# Altium footprint library smd-ipc.PCBLIB: 363 footprints (part 24 of 27)
Each footprint in its own frame and in the unit in brackets; x right, y up, seen from the top. Pads: shape width x height; smd on the part's side, far side on the other; paste and mask are expansions set on the pad; w line width, h text height; cw(c..) or ccw(c..) is an arc to the next point about the centre after c.
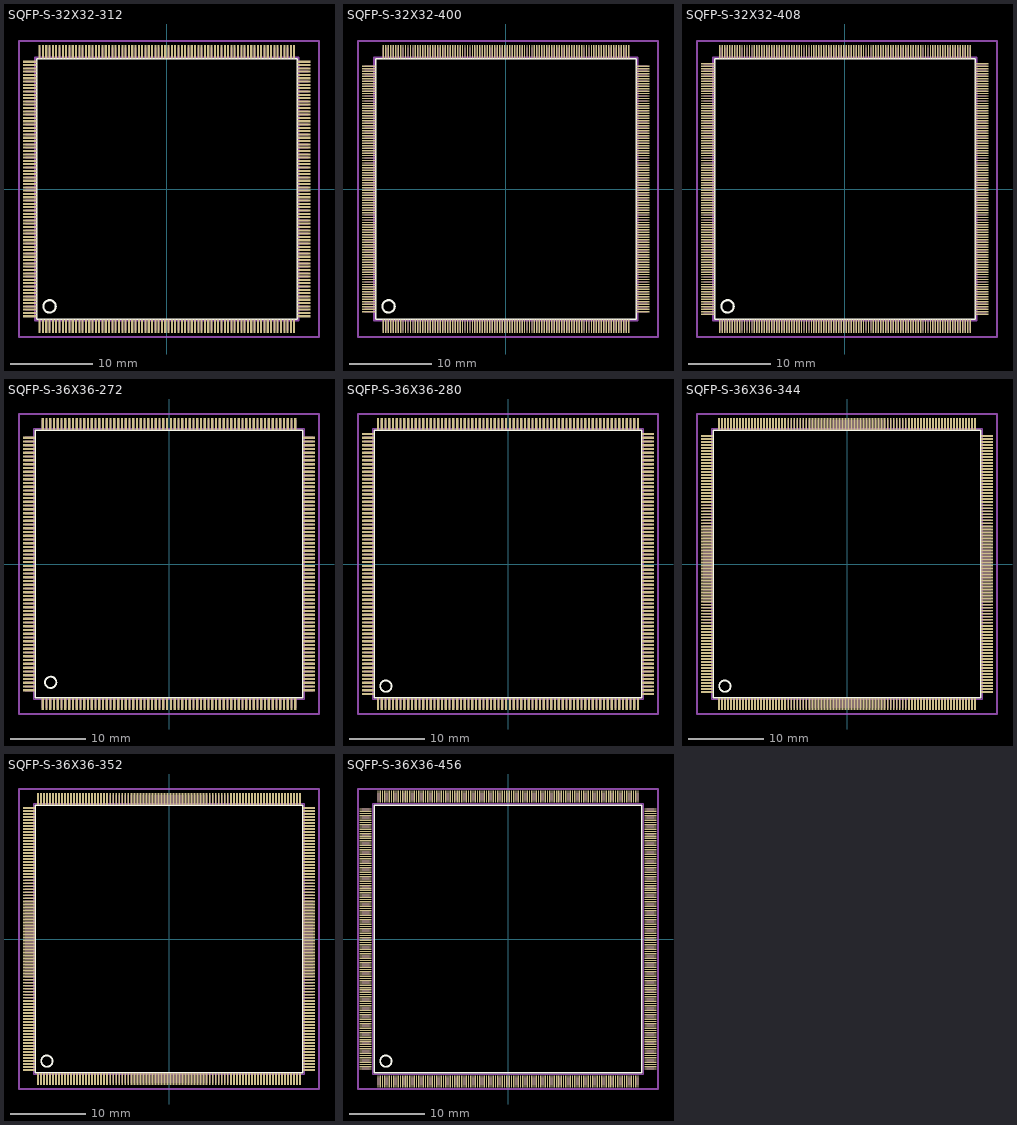
[diagram p23: the footprints below, top view; thin cyan lines are the x and y axes]

## SQFP-S-32X32-312 [mm]
pads (312):
  rect 0.25x1.6 smd: 1(-15.4,-16.6) 2(-15,-16.6) 3(-14.6,-16.6) 4(-14.2,-16.6) 5(-13.8,-16.6) 6(-13.4,-16.6) 7(-13,-16.6) 8(-12.6,-16.6) 9(-12.2,-16.6) 10(-11.8,-16.6) 11(-11.4,-16.6) 12(-11,-16.6) 13(-10.6,-16.6) 14(-10.2,-16.6) 15(-9.8,-16.6) 16(-9.4,-16.6) 17(-9,-16.6) 18(-8.6,-16.6) 19(-8.2,-16.6) 20(-7.8,-16.6) 21(-7.4,-16.6) 22(-7,-16.6) 23(-6.6,-16.6) 24(-6.2,-16.6) 25(-5.8,-16.6) 26(-5.4,-16.6) 27(-5,-16.6) 28(-4.6,-16.6) 29(-4.2,-16.6) 30(-3.8,-16.6) 31(-3.4,-16.6) 32(-3,-16.6) 33(-2.6,-16.6) 34(-2.2,-16.6) 35(-1.8,-16.6) 36(-1.4,-16.6) 37(-1,-16.6) 38(-0.6,-16.6) 39(-0.2,-16.6) 40(0.2,-16.6) 41(0.6,-16.6) 42(1,-16.6) 43(1.4,-16.6) 44(1.8,-16.6) 45(2.2,-16.6) 46(2.6,-16.6) 47(3,-16.6) 48(3.4,-16.6) 49(3.8,-16.6) 50(4.2,-16.6) 51(4.6,-16.6) 52(5,-16.6) 53(5.4,-16.6) 54(5.8,-16.6) 55(6.2,-16.6) 56(6.6,-16.6) 57(7,-16.6) 58(7.4,-16.6) 59(7.8,-16.6) 60(8.2,-16.6) 61(8.6,-16.6) 62(9,-16.6) 63(9.4,-16.6) 64(9.8,-16.6) 65(10.2,-16.6) 66(10.6,-16.6) 67(11,-16.6) 68(11.4,-16.6) 69(11.8,-16.6) 70(12.2,-16.6) 71(12.6,-16.6) 72(13,-16.6) 73(13.4,-16.6) 74(13.8,-16.6) 75(14.2,-16.6) 76(14.6,-16.6) 77(15,-16.6) 78(15.4,-16.6) 157(15.4,16.6) 158(15,16.6) 159(14.6,16.6) 160(14.2,16.6) 161(13.8,16.6) 162(13.4,16.6) 163(13,16.6) 164(12.6,16.6) 165(12.2,16.6) 166(11.8,16.6) 167(11.4,16.6) 168(11,16.6) 169(10.6,16.6) 170(10.2,16.6) 171(9.8,16.6) 172(9.4,16.6) 173(9,16.6) 174(8.6,16.6) 175(8.2,16.6) 176(7.8,16.6) 177(7.4,16.6) 178(7,16.6) 179(6.6,16.6) 180(6.2,16.6) 181(5.8,16.6) 182(5.4,16.6) 183(5,16.6) 184(4.6,16.6) 185(4.2,16.6) 186(3.8,16.6) 187(3.4,16.6) 188(3,16.6) 189(2.6,16.6) 190(2.2,16.6) 191(1.8,16.6) 192(1.4,16.6) 193(1,16.6) 194(0.6,16.6) 195(0.2,16.6) 196(-0.2,16.6) 197(-0.6,16.6) 198(-1,16.6) 199(-1.4,16.6) 200(-1.8,16.6) 201(-2.2,16.6) 202(-2.6,16.6) 203(-3,16.6) 204(-3.4,16.6) 205(-3.8,16.6) 206(-4.2,16.6) 207(-4.6,16.6) 208(-5,16.6) 209(-5.4,16.6) 210(-5.8,16.6) 211(-6.2,16.6) 212(-6.6,16.6) 213(-7,16.6) 214(-7.4,16.6) 215(-7.8,16.6) 216(-8.2,16.6) 217(-8.6,16.6) 218(-9,16.6) 219(-9.4,16.6) 220(-9.8,16.6) 221(-10.2,16.6) 222(-10.6,16.6) 223(-11,16.6) 224(-11.4,16.6) 225(-11.8,16.6) 226(-12.2,16.6) 227(-12.6,16.6) 228(-13,16.6) 229(-13.4,16.6) 230(-13.8,16.6) 231(-14.2,16.6) 232(-14.6,16.6) 233(-15,16.6) 234(-15.4,16.6)
  rect 1.6x0.25 smd: 79(16.6,-15.4) 80(16.6,-15) 81(16.6,-14.6) 82(16.6,-14.2) 83(16.6,-13.8) 84(16.6,-13.4) 85(16.6,-13) 86(16.6,-12.6) 87(16.6,-12.2) 88(16.6,-11.8) 89(16.6,-11.4) 90(16.6,-11) 91(16.6,-10.6) 92(16.6,-10.2) 93(16.6,-9.8) 94(16.6,-9.4) 95(16.6,-9) 96(16.6,-8.6) 97(16.6,-8.2) 98(16.6,-7.8) 99(16.6,-7.4) 100(16.6,-7) 101(16.6,-6.6) 102(16.6,-6.2) 103(16.6,-5.8) 104(16.6,-5.4) 105(16.6,-5) 106(16.6,-4.6) 107(16.6,-4.2) 108(16.6,-3.8) 109(16.6,-3.4) 110(16.6,-3) 111(16.6,-2.6) 112(16.6,-2.2) 113(16.6,-1.8) 114(16.6,-1.4) 115(16.6,-1) 116(16.6,-0.6) 117(16.6,-0.2) 118(16.6,0.2) 119(16.6,0.6) 120(16.6,1) 121(16.6,1.4) 122(16.6,1.8) 123(16.6,2.2) 124(16.6,2.6) 125(16.6,3) 126(16.6,3.4) 127(16.6,3.8) 128(16.6,4.2) 129(16.6,4.6) 130(16.6,5) 131(16.6,5.4) 132(16.6,5.8) 133(16.6,6.2) 134(16.6,6.6) 135(16.6,7) 136(16.6,7.4) 137(16.6,7.8) 138(16.6,8.2) 139(16.6,8.6) 140(16.6,9) 141(16.6,9.4) 142(16.6,9.8) 143(16.6,10.2) 144(16.6,10.6) 145(16.6,11) 146(16.6,11.4) 147(16.6,11.8) 148(16.6,12.2) 149(16.6,12.6) 150(16.6,13) 151(16.6,13.4) 152(16.6,13.8) 153(16.6,14.2) 154(16.6,14.6) 155(16.6,15) 156(16.6,15.4) 235(-16.6,15.4) 236(-16.6,15) 237(-16.6,14.6) 238(-16.6,14.2) 239(-16.6,13.8) 240(-16.6,13.4) 241(-16.6,13) 242(-16.6,12.6) 243(-16.6,12.2) 244(-16.6,11.8) 245(-16.6,11.4) 246(-16.6,11) 247(-16.6,10.6) 248(-16.6,10.2) 249(-16.6,9.8) 250(-16.6,9.4) 251(-16.6,9) 252(-16.6,8.6) 253(-16.6,8.2) 254(-16.6,7.8) 255(-16.6,7.4) 256(-16.6,7) 257(-16.6,6.6) 258(-16.6,6.2) 259(-16.6,5.8) 260(-16.6,5.4) 261(-16.6,5) 262(-16.6,4.6) 263(-16.6,4.2) 264(-16.6,3.8) 265(-16.6,3.4) 266(-16.6,3) 267(-16.6,2.6) 268(-16.6,2.2) 269(-16.6,1.8) 270(-16.6,1.4) 271(-16.6,1) 272(-16.6,0.6) 273(-16.6,0.2) 274(-16.6,-0.2) 275(-16.6,-0.6) 276(-16.6,-1) 277(-16.6,-1.4) 278(-16.6,-1.8) 279(-16.6,-2.2) 280(-16.6,-2.6) 281(-16.6,-3) 282(-16.6,-3.4) 283(-16.6,-3.8) 284(-16.6,-4.2) 285(-16.6,-4.6) 286(-16.6,-5) 287(-16.6,-5.4) 288(-16.6,-5.8) 289(-16.6,-6.2) 290(-16.6,-6.6) 291(-16.6,-7) 292(-16.6,-7.4) 293(-16.6,-7.8) 294(-16.6,-8.2) 295(-16.6,-8.6) 296(-16.6,-9) 297(-16.6,-9.4) 298(-16.6,-9.8) 299(-16.6,-10.2) 300(-16.6,-10.6) 301(-16.6,-11) 302(-16.6,-11.4) 303(-16.6,-11.8) 304(-16.6,-12.2) 305(-16.6,-12.6) 306(-16.6,-13) 307(-16.6,-13.4) 308(-16.6,-13.8) 309(-16.6,-14.2) 310(-16.6,-14.6) 311(-16.6,-15) 312(-16.6,-15.4)
Top Overlay:
  circle w0.254: c-14.2,-14.2 r0.75
  lines w0.203: -15.77,-15.76 15.76,-15.76 15.76,15.76 -15.77,15.76 -15.77,-15.76
Mechanical 16:
  drawing of 316 lines, arcs and shapes, not listed
Mechanical 27:
  lines w0.2: -17.9,-17.9 -17.9,17.9 18.4,17.9 18.4,-17.9 -17.9,-17.9

## SQFP-S-32X32-400 [mm]
pads (400):
  rect 0.17x1.6 smd: 1(-14.85,-16.6) 2(-14.55,-16.6) 3(-14.25,-16.6) 4(-13.95,-16.6) 5(-13.65,-16.6) 6(-13.35,-16.6) 7(-13.05,-16.6) 8(-12.75,-16.6) 9(-12.45,-16.6) 10(-12.15,-16.6) 11(-11.85,-16.6) 12(-11.55,-16.6) 13(-11.25,-16.6) 14(-10.95,-16.6) 15(-10.65,-16.6) 16(-10.35,-16.6) 17(-10.05,-16.6) 18(-9.75,-16.6) 19(-9.45,-16.6) 20(-9.15,-16.6) 21(-8.85,-16.6) 22(-8.55,-16.6) 23(-8.25,-16.6) 24(-7.95,-16.6) 25(-7.65,-16.6) 26(-7.35,-16.6) 27(-7.05,-16.6) 28(-6.75,-16.6) 29(-6.45,-16.6) 30(-6.15,-16.6) 31(-5.85,-16.6) 32(-5.55,-16.6) 33(-5.25,-16.6) 34(-4.95,-16.6) 35(-4.65,-16.6) 36(-4.35,-16.6) 37(-4.05,-16.6) 38(-3.75,-16.6) 39(-3.45,-16.6) 40(-3.15,-16.6) 41(-2.85,-16.6) 42(-2.55,-16.6) 43(-2.25,-16.6) 44(-1.95,-16.6) 45(-1.65,-16.6) 46(-1.35,-16.6) 47(-1.05,-16.6) 48(-0.75,-16.6) 49(-0.45,-16.6) 50(-0.15,-16.6) 51(0.15,-16.6) 52(0.45,-16.6) 53(0.75,-16.6) 54(1.05,-16.6) 55(1.35,-16.6) 56(1.65,-16.6) 57(1.95,-16.6) 58(2.25,-16.6) 59(2.55,-16.6) 60(2.85,-16.6) 61(3.15,-16.6) 62(3.45,-16.6) 63(3.75,-16.6) 64(4.05,-16.6) 65(4.35,-16.6) 66(4.65,-16.6) 67(4.95,-16.6) 68(5.25,-16.6) 69(5.55,-16.6) 70(5.85,-16.6) 71(6.15,-16.6) 72(6.45,-16.6) 73(6.75,-16.6) 74(7.05,-16.6) 75(7.35,-16.6) 76(7.65,-16.6) 77(7.95,-16.6) 78(8.25,-16.6) 79(8.55,-16.6) 80(8.85,-16.6) 81(9.15,-16.6) 82(9.45,-16.6) 83(9.75,-16.6) 84(10.05,-16.6) 85(10.35,-16.6) 86(10.65,-16.6) 87(10.95,-16.6) 88(11.25,-16.6) 89(11.55,-16.6) 90(11.85,-16.6) 91(12.15,-16.6) 92(12.45,-16.6) 93(12.75,-16.6) 94(13.05,-16.6) 95(13.35,-16.6) 96(13.65,-16.6) 97(13.95,-16.6) 98(14.25,-16.6) 99(14.55,-16.6) 100(14.85,-16.6) 201(14.85,16.6) 202(14.55,16.6) 203(14.25,16.6) 204(13.95,16.6) 205(13.65,16.6) 206(13.35,16.6) 207(13.05,16.6) 208(12.75,16.6) 209(12.45,16.6) 210(12.15,16.6) 211(11.85,16.6) 212(11.55,16.6) 213(11.25,16.6) 214(10.95,16.6) 215(10.65,16.6) 216(10.35,16.6) 217(10.05,16.6) 218(9.75,16.6) 219(9.45,16.6) 220(9.15,16.6) 221(8.85,16.6) 222(8.55,16.6) 223(8.25,16.6) 224(7.95,16.6) 225(7.65,16.6) 226(7.35,16.6) 227(7.05,16.6) 228(6.75,16.6) 229(6.45,16.6) 230(6.15,16.6) 231(5.85,16.6) 232(5.55,16.6) 233(5.25,16.6) 234(4.95,16.6) 235(4.65,16.6) 236(4.35,16.6) 237(4.05,16.6) 238(3.75,16.6) 239(3.45,16.6) 240(3.15,16.6) 241(2.85,16.6) 242(2.55,16.6) 243(2.25,16.6) 244(1.95,16.6) 245(1.65,16.6) 246(1.35,16.6) 247(1.05,16.6) 248(0.75,16.6) 249(0.45,16.6) 250(0.15,16.6) 251(-0.15,16.6) 252(-0.45,16.6) 253(-0.75,16.6) 254(-1.05,16.6) 255(-1.35,16.6) 256(-1.65,16.6) 257(-1.95,16.6) 258(-2.25,16.6) 259(-2.55,16.6) 260(-2.85,16.6) 261(-3.15,16.6) 262(-3.45,16.6) 263(-3.75,16.6) 264(-4.05,16.6) 265(-4.35,16.6) 266(-4.65,16.6) 267(-4.95,16.6) 268(-5.25,16.6) 269(-5.55,16.6) 270(-5.85,16.6) 271(-6.15,16.6) 272(-6.45,16.6) 273(-6.75,16.6) 274(-7.05,16.6) 275(-7.35,16.6) 276(-7.65,16.6) 277(-7.95,16.6) 278(-8.25,16.6) 279(-8.55,16.6) 280(-8.85,16.6) 281(-9.15,16.6) 282(-9.45,16.6) 283(-9.75,16.6) 284(-10.05,16.6) 285(-10.35,16.6) 286(-10.65,16.6) 287(-10.95,16.6) 288(-11.25,16.6) 289(-11.55,16.6) 290(-11.85,16.6) 291(-12.15,16.6) 292(-12.45,16.6) 293(-12.75,16.6) 294(-13.05,16.6) 295(-13.35,16.6) 296(-13.65,16.6) 297(-13.95,16.6) 298(-14.25,16.6) 299(-14.55,16.6) 300(-14.85,16.6)
  rect 1.6x0.17 smd: 101(16.6,-14.85) 102(16.6,-14.55) 103(16.6,-14.25) 104(16.6,-13.95) 105(16.6,-13.65) 106(16.6,-13.35) 107(16.6,-13.05) 108(16.6,-12.75) 109(16.6,-12.45) 110(16.6,-12.15) 111(16.6,-11.85) 112(16.6,-11.55) 113(16.6,-11.25) 114(16.6,-10.95) 115(16.6,-10.65) 116(16.6,-10.35) 117(16.6,-10.05) 118(16.6,-9.75) 119(16.6,-9.45) 120(16.6,-9.15) 121(16.6,-8.85) 122(16.6,-8.55) 123(16.6,-8.25) 124(16.6,-7.95) 125(16.6,-7.65) 126(16.6,-7.35) 127(16.6,-7.05) 128(16.6,-6.75) 129(16.6,-6.45) 130(16.6,-6.15) 131(16.6,-5.85) 132(16.6,-5.55) 133(16.6,-5.25) 134(16.6,-4.95) 135(16.6,-4.65) 136(16.6,-4.35) 137(16.6,-4.05) 138(16.6,-3.75) 139(16.6,-3.45) 140(16.6,-3.15) 141(16.6,-2.85) 142(16.6,-2.55) 143(16.6,-2.25) 144(16.6,-1.95) 145(16.6,-1.65) 146(16.6,-1.35) 147(16.6,-1.05) 148(16.6,-0.75) 149(16.6,-0.45) 150(16.6,-0.15) 151(16.6,0.15) 152(16.6,0.45) 153(16.6,0.75) 154(16.6,1.05) 155(16.6,1.35) 156(16.6,1.65) 157(16.6,1.95) 158(16.6,2.25) 159(16.6,2.55) 160(16.6,2.85) 161(16.6,3.15) 162(16.6,3.45) 163(16.6,3.75) 164(16.6,4.05) 165(16.6,4.35) 166(16.6,4.65) 167(16.6,4.95) 168(16.6,5.25) 169(16.6,5.55) 170(16.6,5.85) 171(16.6,6.15) 172(16.6,6.45) 173(16.6,6.75) 174(16.6,7.05) 175(16.6,7.35) 176(16.6,7.65) 177(16.6,7.95) 178(16.6,8.25) 179(16.6,8.55) 180(16.6,8.85) 181(16.6,9.15) 182(16.6,9.45) 183(16.6,9.75) 184(16.6,10.05) 185(16.6,10.35) 186(16.6,10.65) 187(16.6,10.95) 188(16.6,11.25) 189(16.6,11.55) 190(16.6,11.85) 191(16.6,12.15) 192(16.6,12.45) 193(16.6,12.75) 194(16.6,13.05) 195(16.6,13.35) 196(16.6,13.65) 197(16.6,13.95) 198(16.6,14.25) 199(16.6,14.55) 200(16.6,14.85) 301(-16.6,14.85) 302(-16.6,14.55) 303(-16.6,14.25) 304(-16.6,13.95) 305(-16.6,13.65) 306(-16.6,13.35) 307(-16.6,13.05) 308(-16.6,12.75) 309(-16.6,12.45) 310(-16.6,12.15) 311(-16.6,11.85) 312(-16.6,11.55) 313(-16.6,11.25) 314(-16.6,10.95) 315(-16.6,10.65) 316(-16.6,10.35) 317(-16.6,10.05) 318(-16.6,9.75) 319(-16.6,9.45) 320(-16.6,9.15) 321(-16.6,8.85) 322(-16.6,8.55) 323(-16.6,8.25) 324(-16.6,7.95) 325(-16.6,7.65) 326(-16.6,7.35) 327(-16.6,7.05) 328(-16.6,6.75) 329(-16.6,6.45) 330(-16.6,6.15) 331(-16.6,5.85) 332(-16.6,5.55) 333(-16.6,5.25) 334(-16.6,4.95) 335(-16.6,4.65) 336(-16.6,4.35) 337(-16.6,4.05) 338(-16.6,3.75) 339(-16.6,3.45) 340(-16.6,3.15) 341(-16.6,2.85) 342(-16.6,2.55) 343(-16.6,2.25) 344(-16.6,1.95) 345(-16.6,1.65) 346(-16.6,1.35) 347(-16.6,1.05) 348(-16.6,0.75) 349(-16.6,0.45) 350(-16.6,0.15) 351(-16.6,-0.15) 352(-16.6,-0.45) 353(-16.6,-0.75) 354(-16.6,-1.05) 355(-16.6,-1.35) 356(-16.6,-1.65) 357(-16.6,-1.95) 358(-16.6,-2.25) 359(-16.6,-2.55) 360(-16.6,-2.85) 361(-16.6,-3.15) 362(-16.6,-3.45) 363(-16.6,-3.75) 364(-16.6,-4.05) 365(-16.6,-4.35) 366(-16.6,-4.65) 367(-16.6,-4.95) 368(-16.6,-5.25) 369(-16.6,-5.55) 370(-16.6,-5.85) 371(-16.6,-6.15) 372(-16.6,-6.45) 373(-16.6,-6.75) 374(-16.6,-7.05) 375(-16.6,-7.35) 376(-16.6,-7.65) 377(-16.6,-7.95) 378(-16.6,-8.25) 379(-16.6,-8.55) 380(-16.6,-8.85) 381(-16.6,-9.15) 382(-16.6,-9.45) 383(-16.6,-9.75) 384(-16.6,-10.05) 385(-16.6,-10.35) 386(-16.6,-10.65) 387(-16.6,-10.95) 388(-16.6,-11.25) 389(-16.6,-11.55) 390(-16.6,-11.85) 391(-16.6,-12.15) 392(-16.6,-12.45) 393(-16.6,-12.75) 394(-16.6,-13.05) 395(-16.6,-13.35) 396(-16.6,-13.65) 397(-16.6,-13.95) 398(-16.6,-14.25) 399(-16.6,-14.55) 400(-16.6,-14.85)
Top Overlay:
  circle w0.254: c-14.2,-14.2 r0.75
  lines w0.203: -15.77,-15.76 15.76,-15.76 15.76,15.76 -15.77,15.76 -15.77,-15.76
Mechanical 16:
  drawing of 404 lines, arcs and shapes, not listed
Mechanical 27:
  lines w0.2: -17.9,-17.9 -17.9,17.9 18.4,17.9 18.4,-17.9 -17.9,-17.9

## SQFP-S-32X32-408 [mm]
pads (408):
  rect 0.17x1.6 smd: 1(-15.15,-16.6) 2(-14.85,-16.6) 3(-14.55,-16.6) 4(-14.25,-16.6) 5(-13.95,-16.6) 6(-13.65,-16.6) 7(-13.35,-16.6) 8(-13.05,-16.6) 9(-12.75,-16.6) 10(-12.45,-16.6) 11(-12.15,-16.6) 12(-11.85,-16.6) 13(-11.55,-16.6) 14(-11.25,-16.6) 15(-10.95,-16.6) 16(-10.65,-16.6) 17(-10.35,-16.6) 18(-10.05,-16.6) 19(-9.75,-16.6) 20(-9.45,-16.6) 21(-9.15,-16.6) 22(-8.85,-16.6) 23(-8.55,-16.6) 24(-8.25,-16.6) 25(-7.95,-16.6) 26(-7.65,-16.6) 27(-7.35,-16.6) 28(-7.05,-16.6) 29(-6.75,-16.6) 30(-6.45,-16.6) 31(-6.15,-16.6) 32(-5.85,-16.6) 33(-5.55,-16.6) 34(-5.25,-16.6) 35(-4.95,-16.6) 36(-4.65,-16.6) 37(-4.35,-16.6) 38(-4.05,-16.6) 39(-3.75,-16.6) 40(-3.45,-16.6) 41(-3.15,-16.6) 42(-2.85,-16.6) 43(-2.55,-16.6) 44(-2.25,-16.6) 45(-1.95,-16.6) 46(-1.65,-16.6) 47(-1.35,-16.6) 48(-1.05,-16.6) 49(-0.75,-16.6) 50(-0.45,-16.6) 51(-0.15,-16.6) 52(0.15,-16.6) 53(0.45,-16.6) 54(0.75,-16.6) 55(1.05,-16.6) 56(1.35,-16.6) 57(1.65,-16.6) 58(1.95,-16.6) 59(2.25,-16.6) 60(2.55,-16.6) 61(2.85,-16.6) 62(3.15,-16.6) 63(3.45,-16.6) 64(3.75,-16.6) 65(4.05,-16.6) 66(4.35,-16.6) 67(4.65,-16.6) 68(4.95,-16.6) 69(5.25,-16.6) 70(5.55,-16.6) 71(5.85,-16.6) 72(6.15,-16.6) 73(6.45,-16.6) 74(6.75,-16.6) 75(7.05,-16.6) 76(7.35,-16.6) 77(7.65,-16.6) 78(7.95,-16.6) 79(8.25,-16.6) 80(8.55,-16.6) 81(8.85,-16.6) 82(9.15,-16.6) 83(9.45,-16.6) 84(9.75,-16.6) 85(10.05,-16.6) 86(10.35,-16.6) 87(10.65,-16.6) 88(10.95,-16.6) 89(11.25,-16.6) 90(11.55,-16.6) 91(11.85,-16.6) 92(12.15,-16.6) 93(12.45,-16.6) 94(12.75,-16.6) 95(13.05,-16.6) 96(13.35,-16.6) 97(13.65,-16.6) 98(13.95,-16.6) 99(14.25,-16.6) 100(14.55,-16.6) 101(14.85,-16.6) 102(15.15,-16.6) 205(15.15,16.6) 206(14.85,16.6) 207(14.55,16.6) 208(14.25,16.6) 209(13.95,16.6) 210(13.65,16.6) 211(13.35,16.6) 212(13.05,16.6) 213(12.75,16.6) 214(12.45,16.6) 215(12.15,16.6) 216(11.85,16.6) 217(11.55,16.6) 218(11.25,16.6) 219(10.95,16.6) 220(10.65,16.6) 221(10.35,16.6) 222(10.05,16.6) 223(9.75,16.6) 224(9.45,16.6) 225(9.15,16.6) 226(8.85,16.6) 227(8.55,16.6) 228(8.25,16.6) 229(7.95,16.6) 230(7.65,16.6) 231(7.35,16.6) 232(7.05,16.6) 233(6.75,16.6) 234(6.45,16.6) 235(6.15,16.6) 236(5.85,16.6) 237(5.55,16.6) 238(5.25,16.6) 239(4.95,16.6) 240(4.65,16.6) 241(4.35,16.6) 242(4.05,16.6) 243(3.75,16.6) 244(3.45,16.6) 245(3.15,16.6) 246(2.85,16.6) 247(2.55,16.6) 248(2.25,16.6) 249(1.95,16.6) 250(1.65,16.6) 251(1.35,16.6) 252(1.05,16.6) 253(0.75,16.6) 254(0.45,16.6) 255(0.15,16.6) 256(-0.15,16.6) 257(-0.45,16.6) 258(-0.75,16.6) 259(-1.05,16.6) 260(-1.35,16.6) 261(-1.65,16.6) 262(-1.95,16.6) 263(-2.25,16.6) 264(-2.55,16.6) 265(-2.85,16.6) 266(-3.15,16.6) 267(-3.45,16.6) 268(-3.75,16.6) 269(-4.05,16.6) 270(-4.35,16.6) 271(-4.65,16.6) 272(-4.95,16.6) 273(-5.25,16.6) 274(-5.55,16.6) 275(-5.85,16.6) 276(-6.15,16.6) 277(-6.45,16.6) 278(-6.75,16.6) 279(-7.05,16.6) 280(-7.35,16.6) 281(-7.65,16.6) 282(-7.95,16.6) 283(-8.25,16.6) 284(-8.55,16.6) 285(-8.85,16.6) 286(-9.15,16.6) 287(-9.45,16.6) 288(-9.75,16.6) 289(-10.05,16.6) 290(-10.35,16.6) 291(-10.65,16.6) 292(-10.95,16.6) 293(-11.25,16.6) 294(-11.55,16.6) 295(-11.85,16.6) 296(-12.15,16.6) 297(-12.45,16.6) 298(-12.75,16.6) 299(-13.05,16.6) 300(-13.35,16.6) 301(-13.65,16.6) 302(-13.95,16.6) 303(-14.25,16.6) 304(-14.55,16.6) 305(-14.85,16.6) 306(-15.15,16.6)
  rect 1.6x0.17 smd: 103(16.6,-15.15) 104(16.6,-14.85) 105(16.6,-14.55) 106(16.6,-14.25) 107(16.6,-13.95) 108(16.6,-13.65) 109(16.6,-13.35) 110(16.6,-13.05) 111(16.6,-12.75) 112(16.6,-12.45) 113(16.6,-12.15) 114(16.6,-11.85) 115(16.6,-11.55) 116(16.6,-11.25) 117(16.6,-10.95) 118(16.6,-10.65) 119(16.6,-10.35) 120(16.6,-10.05) 121(16.6,-9.75) 122(16.6,-9.45) 123(16.6,-9.15) 124(16.6,-8.85) 125(16.6,-8.55) 126(16.6,-8.25) 127(16.6,-7.95) 128(16.6,-7.65) 129(16.6,-7.35) 130(16.6,-7.05) 131(16.6,-6.75) 132(16.6,-6.45) 133(16.6,-6.15) 134(16.6,-5.85) 135(16.6,-5.55) 136(16.6,-5.25) 137(16.6,-4.95) 138(16.6,-4.65) 139(16.6,-4.35) 140(16.6,-4.05) 141(16.6,-3.75) 142(16.6,-3.45) 143(16.6,-3.15) 144(16.6,-2.85) 145(16.6,-2.55) 146(16.6,-2.25) 147(16.6,-1.95) 148(16.6,-1.65) 149(16.6,-1.35) 150(16.6,-1.05) 151(16.6,-0.75) 152(16.6,-0.45) 153(16.6,-0.15) 154(16.6,0.15) 155(16.6,0.45) 156(16.6,0.75) 157(16.6,1.05) 158(16.6,1.35) 159(16.6,1.65) 160(16.6,1.95) 161(16.6,2.25) 162(16.6,2.55) 163(16.6,2.85) 164(16.6,3.15) 165(16.6,3.45) 166(16.6,3.75) 167(16.6,4.05) 168(16.6,4.35) 169(16.6,4.65) 170(16.6,4.95) 171(16.6,5.25) 172(16.6,5.55) 173(16.6,5.85) 174(16.6,6.15) 175(16.6,6.45) 176(16.6,6.75) 177(16.6,7.05) 178(16.6,7.35) 179(16.6,7.65) 180(16.6,7.95) 181(16.6,8.25) 182(16.6,8.55) 183(16.6,8.85) 184(16.6,9.15) 185(16.6,9.45) 186(16.6,9.75) 187(16.6,10.05) 188(16.6,10.35) 189(16.6,10.65) 190(16.6,10.95) 191(16.6,11.25) 192(16.6,11.55) 193(16.6,11.85) 194(16.6,12.15) 195(16.6,12.45) 196(16.6,12.75) 197(16.6,13.05) 198(16.6,13.35) 199(16.6,13.65) 200(16.6,13.95) 201(16.6,14.25) 202(16.6,14.55) 203(16.6,14.85) 204(16.6,15.15) 307(-16.6,15.15) 308(-16.6,14.85) 309(-16.6,14.55) 310(-16.6,14.25) 311(-16.6,13.95) 312(-16.6,13.65) 313(-16.6,13.35) 314(-16.6,13.05) 315(-16.6,12.75) 316(-16.6,12.45) 317(-16.6,12.15) 318(-16.6,11.85) 319(-16.6,11.55) 320(-16.6,11.25) 321(-16.6,10.95) 322(-16.6,10.65) 323(-16.6,10.35) 324(-16.6,10.05) 325(-16.6,9.75) 326(-16.6,9.45) 327(-16.6,9.15) 328(-16.6,8.85) 329(-16.6,8.55) 330(-16.6,8.25) 331(-16.6,7.95) 332(-16.6,7.65) 333(-16.6,7.35) 334(-16.6,7.05) 335(-16.6,6.75) 336(-16.6,6.45) 337(-16.6,6.15) 338(-16.6,5.85) 339(-16.6,5.55) 340(-16.6,5.25) 341(-16.6,4.95) 342(-16.6,4.65) 343(-16.6,4.35) 344(-16.6,4.05) 345(-16.6,3.75) 346(-16.6,3.45) 347(-16.6,3.15) 348(-16.6,2.85) 349(-16.6,2.55) 350(-16.6,2.25) 351(-16.6,1.95) 352(-16.6,1.65) 353(-16.6,1.35) 354(-16.6,1.05) 355(-16.6,0.75) 356(-16.6,0.45) 357(-16.6,0.15) 358(-16.6,-0.15) 359(-16.6,-0.45) 360(-16.6,-0.75) 361(-16.6,-1.05) 362(-16.6,-1.35) 363(-16.6,-1.65) 364(-16.6,-1.95) 365(-16.6,-2.25) 366(-16.6,-2.55) 367(-16.6,-2.85) 368(-16.6,-3.15) 369(-16.6,-3.45) 370(-16.6,-3.75) 371(-16.6,-4.05) 372(-16.6,-4.35) 373(-16.6,-4.65) 374(-16.6,-4.95) 375(-16.6,-5.25) 376(-16.6,-5.55) 377(-16.6,-5.85) 378(-16.6,-6.15) 379(-16.6,-6.45) 380(-16.6,-6.75) 381(-16.6,-7.05) 382(-16.6,-7.35) 383(-16.6,-7.65) 384(-16.6,-7.95) 385(-16.6,-8.25) 386(-16.6,-8.55) 387(-16.6,-8.85) 388(-16.6,-9.15) 389(-16.6,-9.45) 390(-16.6,-9.75) 391(-16.6,-10.05) 392(-16.6,-10.35) 393(-16.6,-10.65) 394(-16.6,-10.95) 395(-16.6,-11.25) 396(-16.6,-11.55) 397(-16.6,-11.85) 398(-16.6,-12.15) 399(-16.6,-12.45) 400(-16.6,-12.75) 401(-16.6,-13.05) 402(-16.6,-13.35) 403(-16.6,-13.65) 404(-16.6,-13.95) 405(-16.6,-14.25) 406(-16.6,-14.55) 407(-16.6,-14.85) 408(-16.6,-15.15)
Top Overlay:
  circle w0.254: c-14.2,-14.2 r0.75
  lines w0.203: -15.77,-15.76 15.76,-15.76 15.76,15.76 -15.77,15.76 -15.77,-15.76
Mechanical 16:
  drawing of 412 lines, arcs and shapes, not listed
Mechanical 27:
  lines w0.2: -17.9,-17.9 -17.9,17.9 18.4,17.9 18.4,-17.9 -17.9,-17.9

## SQFP-S-36X36-272 [mm]
pads (272):
  rect 0.3x1.6 smd: 1(-16.75,-18.6) 2(-16.25,-18.6) 3(-15.75,-18.6) 4(-15.25,-18.6) 5(-14.75,-18.6) 6(-14.25,-18.6) 7(-13.75,-18.6) 8(-13.25,-18.6) 9(-12.75,-18.6) 10(-12.25,-18.6) 11(-11.75,-18.6) 12(-11.25,-18.6) 13(-10.75,-18.6) 14(-10.25,-18.6) 15(-9.75,-18.6) 16(-9.25,-18.6) 17(-8.75,-18.6) 18(-8.25,-18.6) 19(-7.75,-18.6) 20(-7.25,-18.6) 21(-6.75,-18.6) 22(-6.25,-18.6) 23(-5.75,-18.6) 24(-5.25,-18.6) 25(-4.75,-18.6) 26(-4.25,-18.6) 27(-3.75,-18.6) 28(-3.25,-18.6) 29(-2.75,-18.6) 30(-2.25,-18.6) 31(-1.75,-18.6) 32(-1.25,-18.6) 33(-0.75,-18.6) 34(-0.25,-18.6) 35(0.25,-18.6) 36(0.75,-18.6) 37(1.25,-18.6) 38(1.75,-18.6) 39(2.25,-18.6) 40(2.75,-18.6) 41(3.25,-18.6) 42(3.75,-18.6) 43(4.25,-18.6) 44(4.75,-18.6) 45(5.25,-18.6) 46(5.75,-18.6) 47(6.25,-18.6) 48(6.75,-18.6) 49(7.25,-18.6) 50(7.75,-18.6) 51(8.25,-18.6) 52(8.75,-18.6) 53(9.25,-18.6) 54(9.75,-18.6) 55(10.25,-18.6) 56(10.75,-18.6) 57(11.25,-18.6) 58(11.75,-18.6) 59(12.25,-18.6) 60(12.75,-18.6) 61(13.25,-18.6) 62(13.75,-18.6) 63(14.25,-18.6) 64(14.75,-18.6) 65(15.25,-18.6) 66(15.75,-18.6) 67(16.25,-18.6) 68(16.75,-18.6) 137(16.75,18.6) 138(16.25,18.6) 139(15.75,18.6) 140(15.25,18.6) 141(14.75,18.6) 142(14.25,18.6) 143(13.75,18.6) 144(13.25,18.6) 145(12.75,18.6) 146(12.25,18.6) 147(11.75,18.6) 148(11.25,18.6) 149(10.75,18.6) 150(10.25,18.6) 151(9.75,18.6) 152(9.25,18.6) 153(8.75,18.6) 154(8.25,18.6) 155(7.75,18.6) 156(7.25,18.6) 157(6.75,18.6) 158(6.25,18.6) 159(5.75,18.6) 160(5.25,18.6) 161(4.75,18.6) 162(4.25,18.6) 163(3.75,18.6) 164(3.25,18.6) 165(2.75,18.6) 166(2.25,18.6) 167(1.75,18.6) 168(1.25,18.6) 169(0.75,18.6) 170(0.25,18.6) 171(-0.25,18.6) 172(-0.75,18.6) 173(-1.25,18.6) 174(-1.75,18.6) 175(-2.25,18.6) 176(-2.75,18.6) 177(-3.25,18.6) 178(-3.75,18.6) 179(-4.25,18.6) 180(-4.75,18.6) 181(-5.25,18.6) 182(-5.75,18.6) 183(-6.25,18.6) 184(-6.75,18.6) 185(-7.25,18.6) 186(-7.75,18.6) 187(-8.25,18.6) 188(-8.75,18.6) 189(-9.25,18.6) 190(-9.75,18.6) 191(-10.25,18.6) 192(-10.75,18.6) 193(-11.25,18.6) 194(-11.75,18.6) 195(-12.25,18.6) 196(-12.75,18.6) 197(-13.25,18.6) 198(-13.75,18.6) 199(-14.25,18.6) 200(-14.75,18.6) 201(-15.25,18.6) 202(-15.75,18.6) 203(-16.25,18.6) 204(-16.75,18.6)
  rect 1.6x0.3 smd: 69(18.6,-16.75) 70(18.6,-16.25) 71(18.6,-15.75) 72(18.6,-15.25) 73(18.6,-14.75) 74(18.6,-14.25) 75(18.6,-13.75) 76(18.6,-13.25) 77(18.6,-12.75) 78(18.6,-12.25) 79(18.6,-11.75) 80(18.6,-11.25) 81(18.6,-10.75) 82(18.6,-10.25) 83(18.6,-9.75) 84(18.6,-9.25) 85(18.6,-8.75) 86(18.6,-8.25) 87(18.6,-7.75) 88(18.6,-7.25) 89(18.6,-6.75) 90(18.6,-6.25) 91(18.6,-5.75) 92(18.6,-5.25) 93(18.6,-4.75) 94(18.6,-4.25) 95(18.6,-3.75) 96(18.6,-3.25) 97(18.6,-2.75) 98(18.6,-2.25) 99(18.6,-1.75) 100(18.6,-1.25) 101(18.6,-0.75) 102(18.6,-0.25) 103(18.6,0.25) 104(18.6,0.75) 105(18.6,1.25) 106(18.6,1.75) 107(18.6,2.25) 108(18.6,2.75) 109(18.6,3.25) 110(18.6,3.75) 111(18.6,4.25) 112(18.6,4.75) 113(18.6,5.25) 114(18.6,5.75) 115(18.6,6.25) 116(18.6,6.75) 117(18.6,7.25) 118(18.6,7.75) 119(18.6,8.25) 120(18.6,8.75) 121(18.6,9.25) 122(18.6,9.75) 123(18.6,10.25) 124(18.6,10.75) 125(18.6,11.25) 126(18.6,11.75) 127(18.6,12.25) 128(18.6,12.75) 129(18.6,13.25) 130(18.6,13.75) 131(18.6,14.25) 132(18.6,14.75) 133(18.6,15.25) 134(18.6,15.75) 135(18.6,16.25) 136(18.6,16.75) 205(-18.6,16.75) 206(-18.6,16.25) 207(-18.6,15.75) 208(-18.6,15.25) 209(-18.6,14.75) 210(-18.6,14.25) 211(-18.6,13.75) 212(-18.6,13.25) 213(-18.6,12.75) 214(-18.6,12.25) 215(-18.6,11.75) 216(-18.6,11.25) 217(-18.6,10.75) 218(-18.6,10.25) 219(-18.6,9.75) 220(-18.6,9.25) 221(-18.6,8.75) 222(-18.6,8.25) 223(-18.6,7.75) 224(-18.6,7.25) 225(-18.6,6.75) 226(-18.6,6.25) 227(-18.6,5.75) 228(-18.6,5.25) 229(-18.6,4.75) 230(-18.6,4.25) 231(-18.6,3.75) 232(-18.6,3.25) 233(-18.6,2.75) 234(-18.6,2.25) 235(-18.6,1.75) 236(-18.6,1.25) 237(-18.6,0.75) 238(-18.6,0.25) 239(-18.6,-0.25) 240(-18.6,-0.75) 241(-18.6,-1.25) 242(-18.6,-1.75) 243(-18.6,-2.25) 244(-18.6,-2.75) 245(-18.6,-3.25) 246(-18.6,-3.75) 247(-18.6,-4.25) 248(-18.6,-4.75) 249(-18.6,-5.25) 250(-18.6,-5.75) 251(-18.6,-6.25) 252(-18.6,-6.75) 253(-18.6,-7.25) 254(-18.6,-7.75) 255(-18.6,-8.25) 256(-18.6,-8.75) 257(-18.6,-9.25) 258(-18.6,-9.75) 259(-18.6,-10.25) 260(-18.6,-10.75) 261(-18.6,-11.25) 262(-18.6,-11.75) 263(-18.6,-12.25) 264(-18.6,-12.75) 265(-18.6,-13.25) 266(-18.6,-13.75) 267(-18.6,-14.25) 268(-18.6,-14.75) 269(-18.6,-15.25) 270(-18.6,-15.75) 271(-18.6,-16.25) 272(-18.6,-16.75)